# Altium footprint library SparkFun-Retired.PCBLIB: 303 footprints (part 13 of 19)
Each footprint in its own frame and in the unit in brackets; x right, y up, seen from the top. Pads: shape width x height; smd on the part's side, far side on the other; paste and mask are expansions set on the pad; w line width, h text height; cw(c..) or ccw(c..) is an arc to the next point about the centre after c.
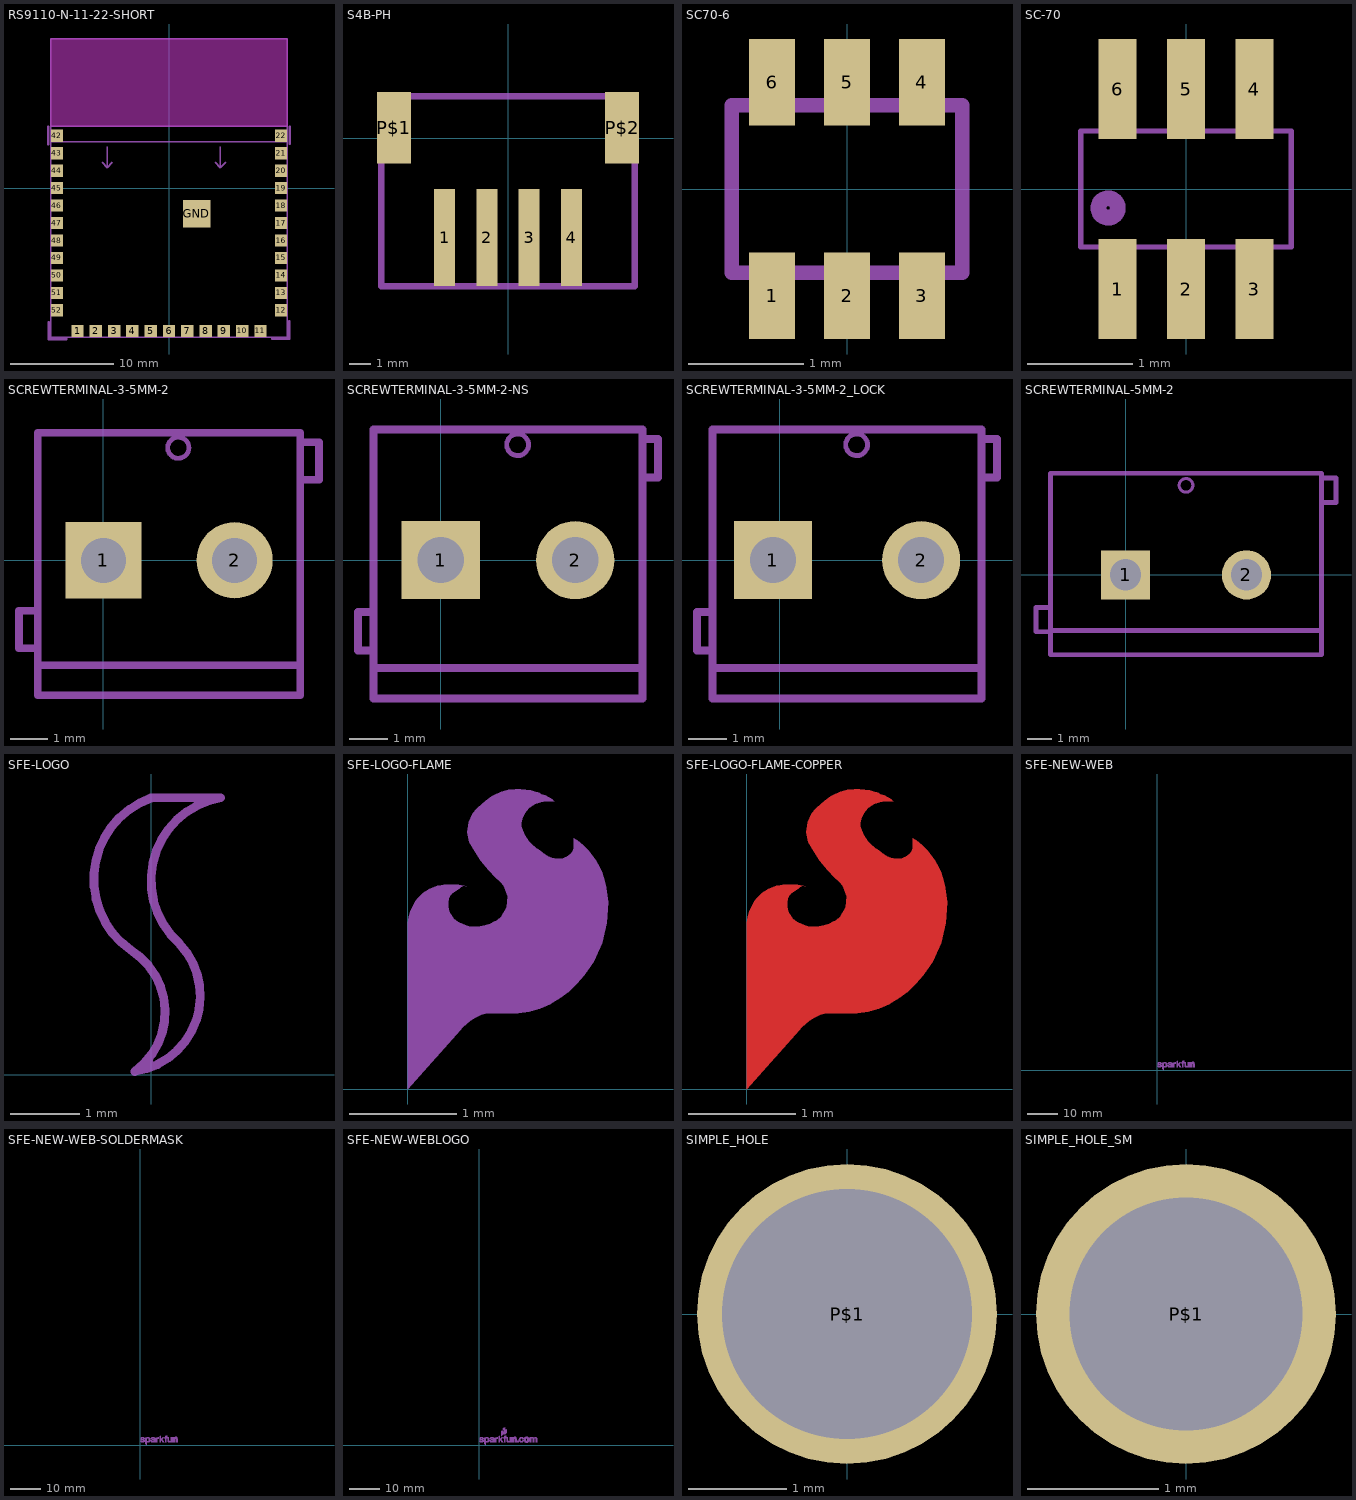
[diagram p12: the footprints below, top view; thin cyan lines are the x and y axes]

## RS9110-N-11-22-SHORT [mil]
pads (34):
  rect 47.24x47.24 smd: 1(-350.39,-547.24) 2(-280.32,-547.24) 3(-210.24,-547.24) 4(-140.16,-547.24) 5(-70.08,-547.24) 6(0,-547.24) 7(70.08,-547.24) 8(140.16,-547.24) 9(210.24,-547.24) 10(280.32,-547.24) 11(350.39,-547.24) 12(429.13,-468.5) 13(429.13,-401.57) 14(429.13,-334.65) 15(429.13,-267.72) 16(429.13,-200.79) 17(429.13,-133.86) 18(429.13,-66.93) 19(429.13,0) 20(429.13,66.93) 21(429.13,133.86) 22(429.13,200.79) 42(-429.13,200.79) 43(-429.13,133.86) 44(-429.13,66.93) 45(-429.13,0) 46(-429.13,-66.93) 47(-429.13,-133.86) 48(-429.13,-200.79) 49(-429.13,-267.72) 50(-429.13,-334.65) 51(-429.13,-401.57) 52(-429.13,-468.5)
  rect 106.3x106.3 smd: GND(106.3,-98.43)
Top keep-out:
  region: -452.76,236.22 -452.76,570.87 452.76,570.87 452.76,236.22
tDocu:
  lines w5: -255.91,98.43 -236.22,78.74 ; -236.22,157.48 -236.22,78.74 ; -216.54,98.43 -236.22,78.74 ; 177.17,98.43 196.85,78.74 ; 196.85,157.48 196.85,78.74 ; 216.54,98.43 196.85,78.74 ; 452.76,177.17 -452.76,177.17 ; -452.76,177.17 -452.76,236.22 ; -452.76,177.17 -452.76,-570.87 452.76,-570.87 452.76,236.22 ; -452.76,236.22 452.76,236.22 ; -452.76,236.22 -452.76,570.87 452.76,570.87 452.76,236.22
  text "no copper" at -157.48,472.44 h77.5
  text "GND plane" at -196.85,118.11 h77.5
tPlace:
  lines w10: -463,168 -463,235 ; -460,-514 -460,-578 -393,-578 ; 396,-577 460,-577 460,-510 ; 463,170 463,234

## S4B-PH [mm]
pads (6):
  rect 1x4.6 smd: 1(-3,-4.7) 2(-1,-4.7) 3(1,-4.7) 4(3,-4.7)
  rect 1.6x3.4 smd: P$1(-5.4,0.5) P$2(5.4,0.5)
tDocu:
  lines w0.305: -6,-7 -6,2 6,2 6,-7 -6,-7

## SC70-6 [mm]
pads (6):
  rect 0.4x0.75 smd paste+0: 1(-0.65,-0.925) 2(0,-0.925) 3(0.65,-0.925) 4(0.65,0.925) 5(0,0.925) 6(-0.65,0.925)
Top Paste:
  region: -0.85,0.55 -0.85,1.3 -0.45,1.3 -0.45,0.55
  region: 0.45,0.55 0.45,1.3 0.85,1.3 0.85,0.55
  region: -0.85,-1.3 -0.85,-0.55 -0.45,-0.55 -0.45,-1.3
  region: -0.2,0.55 -0.2,1.3 0.2,1.3 0.2,0.55
  region: -0.85,-1.3 -0.85,-0.55 -0.45,-0.55 -0.45,-1.3
  region: -0.85,-1.3 -0.85,-0.55 -0.45,-0.55 -0.45,-1.3
  region: -0.201,-1.3 -0.201,-0.55 0.199,-0.55 0.199,-1.3
  region: 0.45,-1.3 0.45,-0.55 0.85,-0.55 0.85,-1.3
tDocu:
  lines w0.127: -1,-0.725 -1,0.725 1,0.725 1,-0.725 -1,-0.725

## SC-70 [mm]
pads (6):
  rect 0.36x0.95 smd: 1(-0.65,-0.95) 2(0,-0.95) 3(0.65,-0.95) 4(0.65,0.95) 5(0,0.95) 6(-0.65,0.95)
tDocu:
  lines w0.05: -1,-0.55 1,-0.55 1,0.55 -1,0.55 -1,-0.55
tPlace:
  circle w0.15: c-0.74,-0.18 r0.092

## SCREWTERMINAL-3-5MM-2 [mil]
pads (2):
  rect 80x80 / inner round 73.91 / far side rect 80x80 hole 47.24: 1(0,0)
  round 80 hole 47.24: 2(137.8,0)
tDocu:
  circle w5: c78.74,118.11 r11.13
  lines w8: -68.9,-92.52 -88.58,-92.52 -88.58,-53.15 -68.9,-53.15 ; 206.69,84.65 226.38,84.65 226.38,124.02 206.69,124.02
tPlace:
  lines w8: -68.9,-110.24 -68.9,-141.73 206.69,-141.73 206.69,-110.24 ; -68.9,-110.24 -68.9,133.86 206.69,133.86 206.69,-110.24 ; -68.9,-110.24 206.69,-110.24

## SCREWTERMINAL-3-5MM-2-NS [mil]
pads (2):
  rect 80x80 / inner round 73.91 / far side rect 80x80 hole 47.24: 1(0,0)
  round 80 hole 47.24: 2(137.8,0)
tDocu:
  circle w5: c78.74,118.11 r11.13
  lines w8: -68.9,-92.52 -84.65,-92.52 -84.65,-53.15 -68.9,-53.15 ; 206.69,84.65 222.44,84.65 222.44,124.02 206.69,124.02 ; -68.9,-110.24 -68.9,-141.73 206.69,-141.73 206.69,-110.24 ; -68.9,-110.24 -68.9,133.86 206.69,133.86 206.69,-110.24 ; -68.9,-110.24 206.69,-110.24

## SCREWTERMINAL-3-5MM-2_LOCK [mil]
pads (2):
  rect 80x80 / inner round 73.91 / far side rect 80x80 hole 47.24: 1(-7,0)
  round 80 hole 47.24: 2(144.8,0)
tDocu:
  circle w5: c78.74,118.11 r11.13
  circle w1: c0,0 r17
  circle w1: c137.8,0 r17
  lines w8: -68.9,-92.52 -84.65,-92.52 -84.65,-53.15 -68.9,-53.15 ; 206.69,84.65 222.44,84.65 222.44,124.02 206.69,124.02
tPlace:
  lines w8: -68.9,-110.24 -68.9,-141.73 206.69,-141.73 206.69,-110.24 ; -68.9,-110.24 -68.9,133.86 206.69,133.86 206.69,-110.24 ; -68.9,-110.24 206.69,-110.24

## SCREWTERMINAL-5MM-2 [mil]
pads (2):
  rect 80x80 / inner round 73.91 / far side rect 80x80 hole 51.18: 1(0,0)
  round 80 hole 51.18: 2(196.85,0)
tDocu:
  circle w5: c98.43,145.67 r11.13
  lines w8: -122.05,-92.52 -145.67,-92.52 -145.67,-53.15 -122.05,-53.15 ; 318.9,118.11 342.52,118.11 342.52,157.48 318.9,157.48
tPlace:
  lines w8: -122.05,-90.55 -122.05,-129.92 318.9,-129.92 318.9,-90.55 ; -122.05,-90.55 -122.05,165.35 318.9,165.35 318.9,-90.55 ; -122.05,-90.55 318.9,-90.55

## SFE-LOGO [mil]
tPlace:
  region: -0.79,6.69 -0.79,10.24 0.79,10.24 0.79,6.69
  lines w5: -11.81,70.87 cw(c16.42,111.13) 0,157.48 39.37,157.48 ccw(c47.49,110.45) 15.75,74.8 cw(c-15.62,44.88) -9.45,1.97 ccw(c-33.76,35.63) -11.81,70.87
  text "parkfun.com" at 51.57,43.31 h77.5

## SFE-LOGO-FLAME [mil]
tPlace:
  drawing of 1 lines, arcs and shapes, not listed

## SFE-LOGO-FLAME-COPPER [mil]
Top:
  region: 207 vertices and 0 holes, not listed, extent -0.03,0.1 73.66,110.43

## SFE-NEW-WEB [mil]
tPlace:
  drawing of 35 lines, arcs and shapes, not listed

## SFE-NEW-WEB-SOLDERMASK [mil]
Top Solder:
  drawing of 35 lines, arcs and shapes, not listed

## SFE-NEW-WEBLOGO [mil]
tPlace:
  drawing of 68 lines, arcs and shapes, not listed

## SIMPLE_HOLE [mil]
pads (1):
  round 120 hole 100: P$1(0,0)

## SIMPLE_HOLE_SM [mil]
pads (1):
  round 90 hole 70: P$1(0,0)